# Altium footprint library KwantLib.PcbLib: 249 footprints (part 4 of 16)
Each footprint in its own frame and in the unit in brackets; x right, y up, seen from the top. Pads: shape width x height; smd on the part's side, far side on the other; paste and mask are expansions set on the pad; w line width, h text height; cw(c..) or ccw(c..) is an arc to the next point about the centre after c.
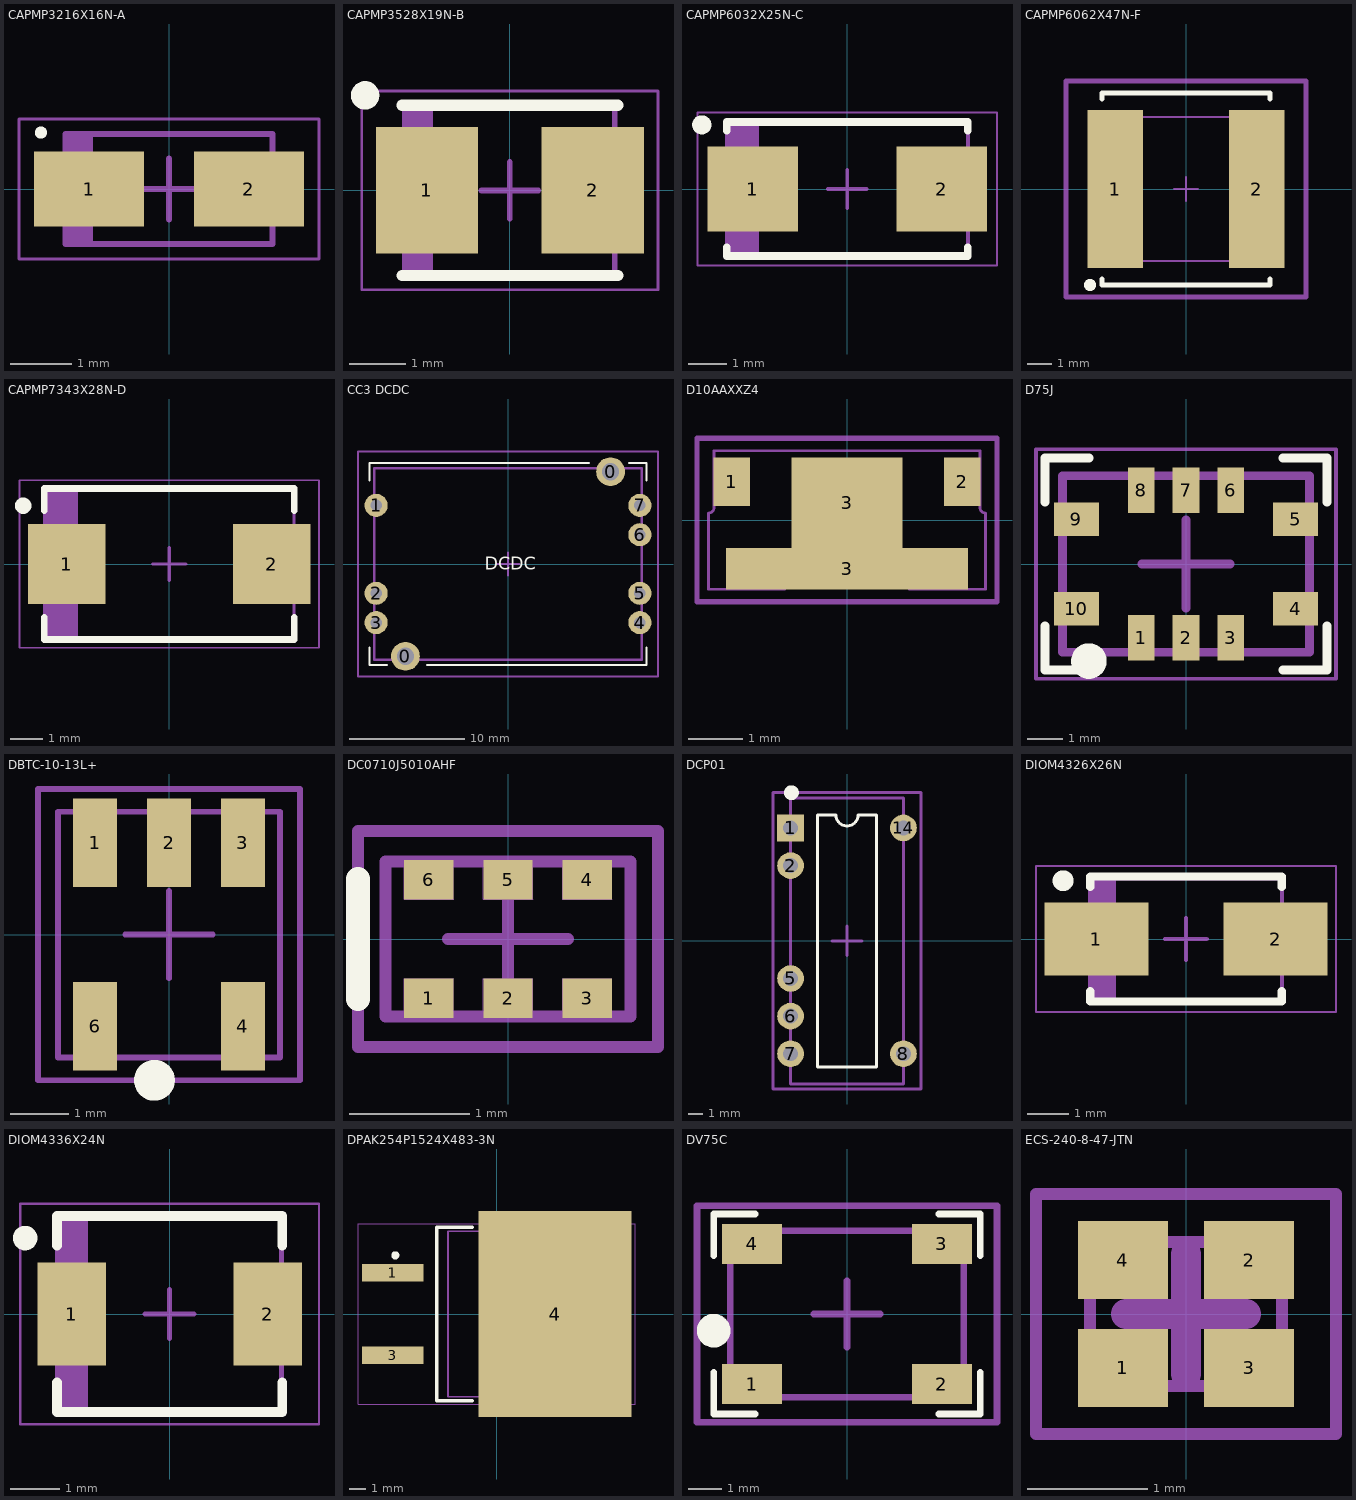
[diagram p3: the footprints below, top view; thin cyan lines are the x and y axes]

## CAPMP3216X16N-A [mm] "Molded Capacitor, 2-Leads, Body 3.20x1.60mm, IPC Medium Density"
height 1.6
pads (2):
  rect 1.8x1.23 smd: 1(-1.31,0) 2(1.31,0)
Top Overlay:
  circle w0.1: c-2.1,0.925 r0.05
Mechanical 13:
  rectangle: -1.7,-0.9 -1.243,0.9
  lines w0.1: -1.7,-0.9 -1.7,0.9 1.7,0.9 1.7,-0.9 -1.7,-0.9
Mechanical 15:
  lines w0.05: -2.46,-1.15 2.46,-1.15 2.46,1.15 -2.46,1.15 -2.46,-1.15
  lines w0.1: -0.5,0 0.5,0 ; 0,-0.5 0,0.5
3D body "CAPMP3216X16N.step": height 1.6, standoff 0, extent -1.92,-0.9 1.92,0.9

## CAPMP3528X19N-B [mm] "Molded Capacitor, 2-Leads, Body 3.50x2.80mm, IPC Medium Density"
height 1.9
pads (2):
  rect 1.8x2.23 smd: 1(-1.46,0) 2(1.46,0)
Top Overlay:
  circle w0.25: c-2.55,1.675 r0.125
  lines w0.2: -1.9,-1.5 1.9,-1.5 ; -1.9,1.5 1.9,1.5
Mechanical 13:
  rectangle: -1.85,-1.5 -1.352,1.5
  lines w0.1: -1.85,-1.5 1.85,-1.5 1.85,1.5 -1.85,1.5 -1.85,-1.5
Mechanical 15:
  lines w0.05: -2.61,-1.75 -2.61,1.75 2.61,1.75 2.61,-1.75 -2.61,-1.75
  lines w0.1: -0.5,0 0.5,0 ; 0,-0.5 0,0.5
3D body "CAPMP3528X19N.step": height 1.9, standoff 0, extent -2.07,-1.5 2.07,1.5

## CAPMP6032X25N-C [mm] "Molded Capacitor, 2-Leads, Body 6.00x3.20mm, IPC Medium Density"
height 2.5
pads (2):
  rect 2.37x2.23 smd: 1(-2.47,0) 2(2.47,0)
Top Overlay:
  circle w0.25: c-3.8,1.675 r0.125
  lines w0.2: -3.15,-1.525 -3.15,-1.75 3.15,-1.75 3.15,-1.525 ; -3.15,1.525 -3.15,1.75 3.15,1.75 3.15,1.525
Mechanical 13:
  rectangle: -3.15,-1.75 -2.303,1.75
  lines w0.1: -3.15,-1.75 3.15,-1.75 3.15,1.75 -3.15,1.75 -3.15,-1.75
Mechanical 15:
  lines w0.05: -3.91,-2 -3.91,2 3.91,2 3.91,-2 -3.91,-2
  lines w0.1: -0.5,0 0.5,0 ; 0,-0.5 0,0.5
3D body "CAPMP6032X25N.step": height 2.5, standoff 0, extent -3.37,-1.75 3.37,1.75

## CAPMP6062X47N-F [mm] "Molded Capacitor, 2-Leads, Body 6.00x6.20mm, IPC Medium Density"
height 4.7
pads (2):
  rect 2.3x6.6 smd: 1(-2.95,0) 2(2.95,0)
Top Overlay:
  circle w0.25: c-4,-4 r0.125
  lines w0.2: -3.5,-3.75 -3.5,-4 3.5,-4 3.5,-3.75 ; -3.5,3.75 -3.5,4 3.5,4 3.5,3.75
Mechanical 13:
  lines w0.1: -3.1,-3 -3.1,3 3.1,3 3.1,-3 -3.1,-3
Mechanical 15:
  lines w0.1: -0.5,0 0.5,0 ; 0,-0.5 0,0.5
  lines w0.2: -5,-4.5 -5,4.5 5,4.5 5,-4.5 -5,-4.5
3D body: height 4.7, standoff 0.1, extent -3.1,-3 3.1,3

## CAPMP7343X28N-D [mm] "Molded Capacitor, 2-Leads, Body 7.30x4.30mm, IPC Medium Density"
height 2.8
pads (2):
  rect 2.37x2.43 smd: 1(-3.12,0) 2(3.12,0)
Top Overlay:
  circle w0.25: c-4.45,1.775 r0.125
  lines w0.2: -3.8,-1.625 -3.8,-2.3 3.8,-2.3 3.8,-1.625 ; -3.8,1.625 -3.8,2.3 3.8,2.3 3.8,1.625
Mechanical 13:
  rectangle: -3.8,-2.3 -2.778,2.3
  lines w0.1: -3.8,-2.3 3.8,-2.3 3.8,2.3 -3.8,2.3 -3.8,-2.3
Mechanical 15:
  lines w0.05: -4.56,-2.55 4.56,-2.55 4.56,2.55 -4.56,2.55 -4.56,-2.55
  lines w0.1: -0.5,0 0.5,0 ; 0,-0.5 0,0.5
3D body "CAPMP7343X28N.step": height 2.8, standoff 0, extent -4.02,-2.3 4.02,2.3

## CC3 DCDC [mm] "TDK Lambda DCDC, Type CC3"
height 8.5
pads (9):
  round 2.5 hole 1.5: 0(-8.89,-8) 0(8.89,8)
  round 2 hole 1: 1(-11.43,5.08) 2(-11.43,-2.54) 3(-11.43,-5.08) 4(11.43,-5.08) 5(11.43,-2.54) 6(11.43,2.54) 7(11.43,5.08)
Top Overlay:
  lines w0.2: -12,-7.25 -12,-8.75 -10.5,-8.75 ; -12,7.25 -12,8.75 7,8.75 ; -7,-8.75 12,-8.75 12,-7.25 ; 10.5,8.75 12,8.75 12,7.25
  text "DCDC" at -2,-0.5 h1.1
Mechanical 13:
  lines w0.2: -11.58,-8.3 11.58,-8.3 11.58,8.3 -11.58,8.3 -11.58,-8.3
Mechanical 15:
  lines w0.2: -1,0 1,0 ; 0,-1 0,1 ; -13,-9.75 13,-9.75 13,9.75 -13,9.75 -13,-9.75
3D body "CC3F Norm.stp": height 8.4, standoff -3.5, extent -11.58,-8.3 11.58,8.3

## D10AAXXZ4 [mil] "Anaren D10AA Attenuator"
height 25.59
pads (4):
  rect 26.38x35.04 smd paste-1.18 mask+2.76: 1(-83.2,27.5) 2(83.2,27.5)
  rect 175x30 smd paste-78.74 mask+2.76: 3(0,-35)
  rect 80x65.35 smd paste-78.74 mask+2.76: 3(0,12.5)
Top Paste:
  rectangle: -31.5,-15.75 31.5,39.37
  rectangle: -82.68,-47.24 82.68,-23.62
Mechanical 13:
  lines w1.97: -100,5 ccw(c-100,9) -96,9 ; -100,5 ccw(c-100,9) -96,9 ; -100,5 -100,-50 -87.5,-50 -45,-50 ; -96,9 -96,10 ; -96,9 -96,10 ; -96,10 -96,45 ; -96,10 -96,45 ; -96,45 -96,50 96,50 96,45 ; -45,-50 cw(c-41,-50) -41,-46 ; -45,-50 cw(c-41,-50) -41,-46 ; -41,-46 -5,-46 ; -41,-46 -5,-46 ; -5,-46 5,-46 ; 5,-46 41,-46 ; 5,-46 41,-46 ; 41,-46 cw(c41,-50) 45,-50 ; 41,-46 cw(c41,-50) 45,-50 ; 45,-50 87.5,-50 100,-50 100,5 ; 96,9 ccw(c100,9) 100,5 ; 96,9 ccw(c100,9) 100,5 ; 96,9 96,10 ; 96,9 96,10 ; 96,10 96,45 ; 96,10 96,45
Mechanical 15:
  lines w3.94: -19.68,0 19.69,0 ; 0,-19.69 0,19.68 ; -108.27,-59.06 108.27,-59.06 108.27,59.06 -108.27,59.06 -108.27,-59.06
3D body "D10AA20Z4.stp": height 25.39, standoff 0, extent -100,-50 100,50

## D75J [mm]
height 2.4
pads (10):
  rect 0.76x1.28 smd: 1(-1.27,-2.09) 2(0,-2.09) 3(1.27,-2.09) 6(1.27,2.09) 7(0,2.09) 8(-1.27,2.09)
  rect 1.28x0.94 smd: 4(3.105,-1.27) 5(3.105,1.27) 9(-3.105,1.27) 10(-3.105,-1.27)
Top Overlay:
  circle w0.508: c-2.75,-2.75 r0.25
  lines w0.254: -4,-1.75 -4,-3 -2.75,-3 ; -4,1.75 -4,3 -2.75,3 ; 2.75,-3 4,-3 4,-1.75 ; 2.75,3 4,3 4,1.75
Mechanical 13:
  lines w0.254: -3.5,-2.5 3.5,-2.5 3.5,2.5 -3.5,2.5 -3.5,-2.5
Mechanical 15:
  lines w0.1: -4.25,-3.25 -4.25,3.25 4.25,3.25 4.25,-3.25 -4.25,-3.25
  lines w0.254: -1.25,0 1.25,0 ; 0,-1.25 0,1.25
3D body "D75J.stp": height 2.49, standoff 0, extent -3.5,-2.5 3.5,2.5

## DBTC-10-13L+ [mm] "Directional Coupler"
height 4.5
pads (5):
  rect 0.76x1.52 smd mask+0.07: 1(-1.27,1.575) 2(0,1.575) 3(1.27,1.575) 4(1.27,-1.575) 6(-1.27,-1.575)
Top Overlay:
  circle w0.4: c-0.25,-2.5 r0.15
Mechanical 13:
  lines w0.1: -1.905,-2.11 -1.905,2.11 1.905,2.11 1.905,-2.11 -1.905,-2.11
Mechanical 15:
  lines w0.1: -0.75,0 0.75,0 ; 0,-0.75 0,0.75 ; -2.25,-2.5 2.25,-2.5 2.25,2.5 -2.25,2.5 -2.25,-2.5
3D body "DBTC-10-13L+.stp": height 3.89, standoff -0.05, extent -1.905,-2.11 1.905,2.11

## DC0710J5010AHF [mm] "Directional Coupler"
height 0.76
pads (6):
  rect 0.41x0.33 smd mask+0.07: 1(-0.66,-0.495) 2(0,-0.495) 3(0.66,-0.495) 4(0.66,0.495) 5(0,0.495) 6(-0.66,0.495)
Top Overlay:
  lines w0.2: -1.25,-0.5 -1.25,0.5
Mechanical 1:
  lines w0.01: -0.865,-0.66 -0.455,-0.66 ; -0.865,-0.66 -0.865,-0.33 ; -0.865,-0.66 -0.455,-0.33 ; -0.865,-0.33 -0.455,-0.33 ; -0.865,-0.33 -0.455,-0.66 ; -0.865,0.33 -0.455,0.33 ; -0.865,0.33 -0.865,0.66 ; -0.865,0.33 -0.455,0.66 ; -0.865,0.66 -0.455,0.66 ; -0.865,0.66 -0.455,0.33 ; -0.455,-0.66 -0.455,-0.33 ; -0.455,0.33 -0.455,0.66 ; -0.205,-0.66 0.205,-0.66 ; -0.205,-0.66 -0.205,-0.33 ; -0.205,-0.66 0.205,-0.33 ; -0.205,-0.33 0.205,-0.33 ; -0.205,-0.33 0.205,-0.66 ; -0.205,0.33 0.205,0.33 ; -0.205,0.33 -0.205,0.66 ; -0.205,0.33 0.205,0.66 ; -0.205,0.66 0.205,0.66 ; -0.205,0.66 0.205,0.33 ; 0.205,-0.66 0.205,-0.33 ; 0.205,0.33 0.205,0.66 ; 0.455,-0.66 0.865,-0.66 ; 0.455,-0.66 0.455,-0.33 ; 0.455,-0.66 0.865,-0.33 ; 0.455,-0.33 0.865,-0.33 ; 0.455,-0.33 0.865,-0.66 ; 0.455,0.33 0.865,0.33 ; 0.455,0.33 0.455,0.66 ; 0.455,0.33 0.865,0.66 ; 0.455,0.66 0.865,0.66 ; 0.455,0.66 0.865,0.33 ; 0.865,-0.66 0.865,-0.33 ; 0.865,0.33 0.865,0.66 ; -1.02,-0.645 1.02,-0.645 1.02,0.645 -1.02,0.645 -1.02,-0.645
Mechanical 13:
  lines w0.1: -1.02,-0.645 -1.02,0.645 1.02,0.645 1.02,-0.645 -1.02,-0.645
Mechanical 15:
  lines w0.1: -0.5,0 0.5,0 ; 0,-0.5 0,0.5 ; -1.25,-0.9 -1.25,0.9 1.25,0.9 1.25,-0.9 -1.25,-0.9
3D body: height 0.76, standoff 0, extent -1.02,-0.645 1.02,0.645

## DCP01 [mm]
height 5.33
pads (7):
  rect 1.8x1.8 hole 1: 1(-3.81,7.62)
  round 1.8 hole 1: 2(-3.81,5.08) 5(-3.81,-2.54) 6(-3.81,-5.08) 7(-3.81,-7.62) 8(3.81,-7.62) 14(3.81,7.62)
Top Overlay:
  circle w0.5: c-3.75,10 r0.25
  lines w0.2: -2,-8.5 -2,8.5 -0.75,8.5 ccw(c0,8.5) 0.75,8.5 2,8.5 2,-8.5 -2,-8.5
Mechanical 13:
  lines w0.2: -3.81,-9.65 -3.81,9.65 3.81,9.65 3.81,-9.65 -3.81,-9.65
Mechanical 15:
  lines w0.2: -1,0 1,0 ; 0,-1 0,1 ; -5,-10 5,-10 5,10 -5,10 -5,-10
3D body "DCP01-Center.stp": height 3.95, standoff -3.21, extent -3.81,-9.65 3.81,9.65

## DIOM4326X26N [mm] "Molded Diode, 2-Leads, Body 4,30x2,61mm, IPC Medium Density"
height 2.6
pads (2):
  rect 2.5x1.75 smd: 1(-2.15,0) 2(2.15,0)
Top Overlay:
  circle w0.25: c-2.95,1.4 r0.125
  lines w0.2: -2.3,-1.25 -2.3,-1.5 2.3,-1.5 2.3,-1.25 ; -2.3,1.25 -2.3,1.5 2.3,1.5 2.3,1.25
Mechanical 13:
  rectangle: -2.3,-1.46 -1.681,1.46
  lines w0.1: -2.3,-1.46 2.3,-1.46 2.3,1.46 -2.3,1.46 -2.3,-1.46
Mechanical 15:
  lines w0.05: -3.6,-1.75 3.6,-1.75 3.6,1.75 -3.6,1.75 -3.6,-1.75
  lines w0.1: -0.5,0 0.5,0 ; 0,-0.5 0,0.5
3D body "DIOM4326X26N.step": height 2.6, standoff 0, extent -2.52,-1.46 2.52,1.46

## DIOM4336X24N [mm] "Molded Diode, 2-Leads, Body 4.31x3.62mm, IPC Medium Density"
height 2.4
pads (2):
  rect 1.4x2.1 smd paste-0.06 mask+0.07: 1(-2,0) 2(2,0)
Top Overlay:
  circle w0.25: c-2.95,1.55 r0.125
  lines w0.2: -2.3,-1.4 -2.3,-2 2.3,-2 2.3,-1.4 ; -2.3,1.4 -2.3,2 2.3,2 2.3,1.4
Mechanical 13:
  rectangle: -2.285,-1.97 -1.67,1.97
  lines w0.1: -2.285,-1.97 -2.285,1.97 2.285,1.97 2.285,-1.97 -2.285,-1.97
Mechanical 15:
  lines w0.05: -3.05,-2.25 -3.05,2.25 3.05,2.25 3.05,-2.25 -3.05,-2.25
  lines w0.1: -0.5,0 0.5,0 ; 0,-0.5 0,0.5
3D body "DIOM4336X24N.step": height 2.4, standoff 0, extent -2.505,-1.97 2.505,1.97

## DPAK254P1524X483-3N [mm] "D2-PAK, 3-Pads, Body 7,93x8,70mm (max), IPC Medium Density"
height 4.83
pads (3):
  rect 3.8x1.1 smd: 1(-6.4,2.54) 3(-6.4,-2.54)
  rect 9.45x12.7 smd: 4(3.6,0)
Top Overlay:
  circle w0.25: c-6.25,3.615 r0.125
  lines w0.2: -1.5,-5.35 -3.7,-5.35 -3.7,5.35 -1.5,5.35
Mechanical 13:
  lines w0.1: -3,-5.1 -3,5.1 7.3,5.1 7.3,-5.1 -3,-5.1
Mechanical 15:
  lines w0.05: -8.55,-5.575 8.55,-5.575 8.55,5.575 -8.55,5.575 -8.55,-5.575
  lines w0.1: -0.5,0 0.5,0 ; 0,-0.5 0,0.5
3D body "User Library-DPAK.step": height 4.88, standoff -0.13, extent -8.016,-5.08 7.248,5.08

## DV75C [mm] "TCXO"
height 2.4
pads (4):
  rect 1.8x1.2 smd paste-0.05 mask+0.07: 1(-2.85,-2.1) 2(2.85,-2.1) 3(2.85,2.1) 4(-2.85,2.1)
Top Overlay:
  circle w0.508: c-4,-0.5 r0.25
  lines w0.2: -4,-1.75 -4,-3 -2.75,-3 ; -4,1.75 -4,3 -2.75,3 ; 2.75,-3 4,-3 4,-1.75 ; 2.75,3 4,3 4,1.75
Mechanical 13:
  lines w0.2: -3.5,-2.5 3.5,-2.5 3.5,2.5 -3.5,2.5 -3.5,-2.5
Mechanical 15:
  lines w0.2: -1,0 1,0 ; 0,-1 0,1 ; -4.5,-3.25 -4.5,3.25 4.5,3.25 4.5,-3.25 -4.5,-3.25
3D body "DV75C.stp": height 2.49, standoff 0, extent -3.5,-2.5 3.5,2.5

## ECS-240-8-47-JTN [mm]
height 0.3
pads (4):
  rect 0.75x0.65 smd paste-0.05 mask+0.075: 1(-0.525,-0.45) 2(0.525,0.45) 3(0.525,-0.45) 4(-0.525,0.45)
Mechanical 13:
  lines w0.1: -0.8,-0.6 0.8,-0.6 0.8,0.6 -0.8,0.6 -0.8,-0.6
Mechanical 15:
  lines w0.1: -1.25,-1 1.25,-1 1.25,1 -1.25,1 -1.25,-1
  lines w0.254: -0.5,0 0.5,0 ; 0,-0.5 0,0.5
3D body "ECS-240-8-47-JTN.stp": height 0.33, standoff 0, extent -0.8,-0.6 0.8,0.6